# Altium footprint library Inductors THD.PcbLib: 43 footprints (part 3 of 4)
Each footprint in its own frame and in the unit in brackets; x right, y up, seen from the top. Pads: shape width x height; smd on the part's side, far side on the other; paste and mask are expansions set on the pad; w line width, h text height; cw(c..) or ccw(c..) is an arc to the next point about the centre after c.
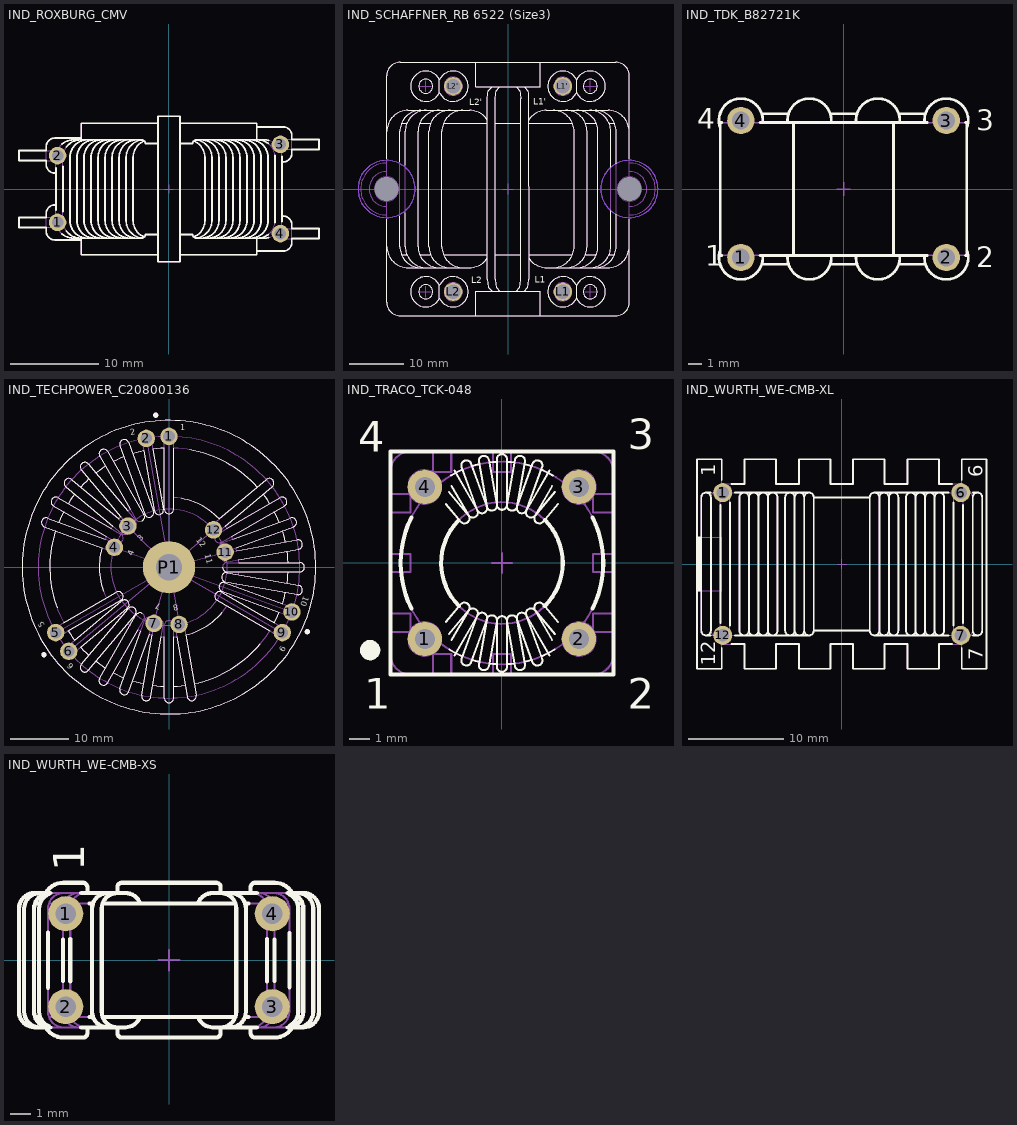
[diagram p2: the footprints below, top view; thin cyan lines are the x and y axes]

## IND_ROXBURG_CMV [mm] "PCB Mounted Common Mode Chokes Body L 34mm x W 17mm x H 31mm"
height 32
pads (4):
  round 2 hole 1.3: 1(-12.7,-3.81) 2(-12.7,3.81) 3(12.7,5.08) 4(12.7,-5.08)
Top Overlay:
  lines w0.2: -12.89,-2.423 -12.89,2.423 ; -12.89,-1.81 -13,-1.81 ccw(c-13,-2.81) -14,-2.81 -14,-3.24 -17.095,-3.24 -17.095,-4.38 -14,-4.38 -14,-4.81 ccw(c-13,-4.81) -13,-5.81 -10,-5.81 ; -12.89,1.81 -13,1.81 cw(c-13,2.81) -14,2.81 -14,3.24 -17.095,3.24 -17.095,4.38 -14,4.38 -14,4.81 cw(c-13,4.81) -13,5.81 -10,5.81 ; -12.195,-5.116 ccw(c-10.89,-3.6) -10.89,-5.6 -3.16,-5.6 ccw(c-3.16,-5.1) -2.67,-5.2 -1.25,-5.2 ; -12.195,5.116 cw(c-10.89,3.6) -10.89,5.6 -3.16,5.6 cw(c-3.16,5.1) -2.67,5.2 -1.25,5.2 ; -12.09,-2.55 -12.09,2.55 ; -11.699,-4.788 ccw(c-10.09,-3.6) -10.09,-5.6 ; -11.699,4.788 cw(c-10.09,3.6) -10.09,5.6 ; -10,-5.6 -10,-7.5 -1.25,-7.5 ; -10,5.6 -10,7.5 -1.25,7.5 ; -9.29,-5.6 cw(c-9.29,-3.6) -11.29,-3.6 -11.29,3.6 cw(c-9.29,3.6) -9.29,5.6 ; -8.49,-5.6 cw(c-8.49,-3.6) -10.49,-3.6 -10.49,3.6 cw(c-8.49,3.6) -8.49,5.6 ; -7.69,-5.6 cw(c-7.69,-3.6) -9.69,-3.6 -9.69,3.6 cw(c-7.69,3.6) -7.69,5.6 ; -6.89,-5.6 cw(c-6.89,-3.6) -8.89,-3.6 -8.89,3.6 cw(c-6.89,3.6) -6.89,5.6 ; -6.09,-5.6 cw(c-6.09,-3.6) -8.09,-3.6 -8.09,3.6 cw(c-6.09,3.6) -6.09,5.6 ; -5.29,-5.6 cw(c-5.29,-3.6) -7.29,-3.6 -7.29,3.6 cw(c-5.29,3.6) -5.29,5.6 ; -4.66,5.6 ccw(c-4.476,3.594) -6.49,3.6 -6.49,-3.6 ccw(c-4.49,-3.6) -4.49,-5.6 ; -3.69,-5.6 cw(c-3.69,-3.6) -5.69,-3.6 -5.69,3.6 cw(c-3.69,3.6) -3.69,5.6 ; -3.07,-5.592 cw(c-2.89,-3.6) -4.89,-3.6 -4.89,3.6 cw(c-2.89,3.6) -3.07,5.592 ; -2.82,5.466 ccw(c-2.076,3.594) -4.09,3.6 -4.09,-3.6 ccw(c-2.09,-3.6) -2.817,-5.463 ; 1.25,-7.5 10,-7.5 10,-5.6 ; 1.25,-5.2 2.67,-5.2 ccw(c3.16,-5.1) 3.16,-5.6 10.89,-5.6 ccw(c10.89,-3.6) 11.378,-5.54 ; 1.25,5.2 2.67,5.2 cw(c3.16,5.1) 3.16,5.6 10.89,5.6 cw(c10.89,3.6) 11.378,5.54 ; 1.25,7.5 10,7.5 10,5.6 ; 2.817,-5.463 ccw(c2.09,-3.6) 4.09,-3.6 4.09,3.6 ccw(c2.076,3.594) 2.82,5.466 ; 3.07,-5.592 ccw(c2.89,-3.6) 4.89,-3.6 4.89,3.6 ccw(c2.89,3.6) 3.07,5.592 ; 3.69,-5.6 ccw(c3.69,-3.6) 5.69,-3.6 5.69,3.6 ccw(c3.69,3.6) 3.69,5.6 ; 4.49,-5.6 ccw(c4.49,-3.6) 6.49,-3.6 6.49,3.6 ccw(c4.476,3.594) 4.66,5.6 ; 5.29,-5.6 ccw(c5.29,-3.6) 7.29,-3.6 7.29,3.6 ccw(c5.29,3.6) 5.29,5.6 ; 6.09,-5.6 ccw(c6.09,-3.6) 8.09,-3.6 8.09,3.6 ccw(c6.09,3.6) 6.09,5.6 ; 6.89,-5.6 ccw(c6.89,-3.6) 8.89,-3.6 8.89,3.6 ccw(c6.89,3.6) 6.89,5.6 ; 7.69,-5.6 ccw(c7.69,-3.6) 9.69,-3.6 9.69,3.6 ccw(c7.69,3.6) 7.69,5.6 ; 8.49,-5.6 ccw(c8.49,-3.6) 10.49,-3.6 10.49,3.6 ccw(c8.49,3.6) 8.49,5.6 ; 9.29,-5.6 ccw(c9.29,-3.6) 11.29,-3.6 11.29,3.6 ccw(c9.29,3.6) 9.29,5.6 ; 10,-7.08 13,-7.08 ccw(c13,-6.08) 14,-6.08 14,-5.65 17.096,-5.65 17.096,-4.51 14,-4.51 14,-4.08 ccw(c13,-4.08) 13,-3.08 12.9,-3.08 ; 10,7.08 13,7.08 cw(c13,6.08) 14,6.08 14,5.65 17.096,5.65 17.096,4.51 14,4.51 14,4.08 cw(c13,4.08) 13,3.08 12.9,3.08 ; 10.09,-5.6 ccw(c10.09,-3.6) 11.304,-5.189 ; 10.09,5.6 cw(c10.09,3.6) 11.304,5.189 ; 12.077,-3.826 ccw(c10.09,-3.6) 12.09,-3.6 12.09,3.6 ccw(c10.09,3.6) 12.077,3.826 ; 12.888,-3.693 ccw(c10.89,-3.6) 12.89,-3.6 12.89,3.6 ccw(c10.89,3.6) 12.888,3.693 ; -1.25,-8.3 1.25,-8.3 1.25,8.3 -1.25,8.3 -1.25,-8.3
Mechanical 8:
  lines w0.1: -13.2,-3.81 -12.7,-3.81 ; -13.2,3.81 -12.7,3.81 ; -12.7,-4.31 -12.7,-3.81 ; -12.7,-3.31 -12.7,-3.81 ; -12.7,3.31 -12.7,3.81 ; -12.7,4.31 -12.7,3.81 ; -12.2,-3.81 -12.7,-3.81 ; -12.2,3.81 -12.7,3.81 ; -0.5,0 0,0 ; 0,-0.5 0,0 ; 0,0.5 0,0 ; 0.5,0 0,0 ; 12.2,-5.08 12.7,-5.08 ; 12.2,5.08 12.7,5.08 ; 12.7,-5.58 12.7,-5.08 ; 12.7,-4.58 12.7,-5.08 ; 12.7,4.58 12.7,5.08 ; 12.7,5.58 12.7,5.08 ; 13.2,-5.08 12.7,-5.08 ; 13.2,5.08 12.7,5.08
Mechanical 14:
  lines w0.1: -12.89,-3.24 -17.095,-3.24 -17.095,-4.38 -12.732,-4.38 ; -12.89,-1.81 -13,-1.81 ccw(c-13,-2.81) -14,-2.81 -14,-4.81 ccw(c-13,-4.81) -13,-5.81 -10,-5.81 ; -12.89,1.81 -13,1.81 cw(c-13,2.81) -14,2.81 -14,4.81 cw(c-13,4.81) -13,5.81 -10,5.81 ; -12.89,3.24 -17.095,3.24 -17.095,4.38 -12.732,4.38 ; -10.09,-5.6 cw(c-10.09,-3.6) -12.09,-3.6 -12.09,3.6 cw(c-10.09,3.6) -10.09,5.6 ; -10,-5.6 -10,-7.5 -1.25,-7.5 ; -10,5.6 -10,7.5 -1.25,7.5 ; -9.29,-5.6 cw(c-9.29,-3.6) -11.29,-3.6 -11.29,3.6 cw(c-9.29,3.6) -9.29,5.6 ; -8.49,-5.6 cw(c-8.49,-3.6) -10.49,-3.6 -10.49,3.6 cw(c-8.49,3.6) -8.49,5.6 ; -7.69,-5.6 cw(c-7.69,-3.6) -9.69,-3.6 -9.69,3.6 cw(c-7.69,3.6) -7.69,5.6 ; -6.89,-5.6 cw(c-6.89,-3.6) -8.89,-3.6 -8.89,3.6 cw(c-6.89,3.6) -6.89,5.6 ; -6.09,-5.6 cw(c-6.09,-3.6) -8.09,-3.6 -8.09,3.6 cw(c-6.09,3.6) -6.09,5.6 ; -5.29,-5.6 cw(c-5.29,-3.6) -7.29,-3.6 -7.29,3.6 cw(c-5.29,3.6) -5.29,5.6 ; -4.66,5.6 ccw(c-4.476,3.594) -6.49,3.6 -6.49,-3.6 ccw(c-4.49,-3.6) -4.49,-5.6 ; -3.69,-5.6 cw(c-3.69,-3.6) -5.69,-3.6 -5.69,3.6 cw(c-3.69,3.6) -3.69,5.6 ; -3.07,-5.592 cw(c-2.89,-3.6) -4.89,-3.6 -4.89,3.6 cw(c-2.89,3.6) -3.07,5.592 ; -2.82,5.466 ccw(c-2.076,3.594) -4.09,3.6 -4.09,-3.6 ccw(c-2.09,-3.6) -2.817,-5.463 ; -1.25,-5.2 -2.67,-5.2 cw(c-3.16,-5.1) -3.16,-5.6 -10.89,-5.6 cw(c-10.89,-3.6) -12.89,-3.6 -12.89,3.6 cw(c-10.89,3.6) -10.89,5.6 -3.16,5.6 cw(c-3.16,5.1) -2.67,5.2 -1.25,5.2 ; 1.25,-7.5 10,-7.5 10,-5.6 ; 1.25,-5.2 2.67,-5.2 ccw(c3.16,-5.1) 3.16,-5.6 10.89,-5.6 ccw(c10.89,-3.6) 12.89,-3.6 12.89,3.6 ccw(c10.89,3.6) 10.89,5.6 3.16,5.6 ccw(c3.16,5.1) 2.67,5.2 1.25,5.2 ; 1.25,7.5 10,7.5 10,5.6 ; 2.817,-5.463 ccw(c2.09,-3.6) 4.09,-3.6 4.09,3.6 ccw(c2.076,3.594) 2.82,5.466 ; 3.07,-5.592 ccw(c2.89,-3.6) 4.89,-3.6 4.89,3.6 ccw(c2.89,3.6) 3.07,5.592 ; 3.69,-5.6 ccw(c3.69,-3.6) 5.69,-3.6 5.69,3.6 ccw(c3.69,3.6) 3.69,5.6 ; 4.49,-5.6 ccw(c4.49,-3.6) 6.49,-3.6 6.49,3.6 ccw(c4.476,3.594) 4.66,5.6 ; 5.29,-5.6 ccw(c5.29,-3.6) 7.29,-3.6 7.29,3.6 ccw(c5.29,3.6) 5.29,5.6 ; 6.09,-5.6 ccw(c6.09,-3.6) 8.09,-3.6 8.09,3.6 ccw(c6.09,3.6) 6.09,5.6 ; 6.89,-5.6 ccw(c6.89,-3.6) 8.89,-3.6 8.89,3.6 ccw(c6.89,3.6) 6.89,5.6 ; 7.69,-5.6 ccw(c7.69,-3.6) 9.69,-3.6 9.69,3.6 ccw(c7.69,3.6) 7.69,5.6 ; 8.49,-5.6 ccw(c8.49,-3.6) 10.49,-3.6 10.49,3.6 ccw(c8.49,3.6) 8.49,5.6 ; 9.29,-5.6 ccw(c9.29,-3.6) 11.29,-3.6 11.29,3.6 ccw(c9.29,3.6) 9.29,5.6 ; 10,-7.08 13,-7.08 ccw(c13,-6.08) 14,-6.08 14,-4.08 ccw(c13,-4.08) 13,-3.08 12.9,-3.08 ; 10,7.08 13,7.08 cw(c13,6.08) 14,6.08 14,4.08 cw(c13,4.08) 13,3.08 12.9,3.08 ; 10.09,-5.6 ccw(c10.09,-3.6) 12.09,-3.6 12.09,3.6 ccw(c10.09,3.6) 10.09,5.6 ; 12.51,-4.787 12.51,-5.65 17.096,-5.65 17.096,-4.51 12.681,-4.51 ; 12.51,4.787 12.51,5.65 17.096,5.65 17.096,4.51 12.681,4.51 ; -1.25,-8.3 1.25,-8.3 1.25,8.3 -1.25,8.3 -1.25,-8.3
3D body "IND_ROXBURG_CMV.stp": height 31, standoff -3.6, extent -17.095,-8.3 17.096,8.3

## IND_SCHAFFNER_RB 6522 (Size3) [mm] "PCB Mounted Common Mode Chokes, Body L 45mm x W 46.93mm x H 52mm"
height 52
pads (6):
  round 1 hole 4.5 unplated mask+1.75: 5(-22.5,0) 6(22.5,0)
  round 3.4 hole 2.7: L1(10.16,-19.05) L1'(10.16,19.05) L2(-10.16,-19.05) L2'(-10.16,19.05)
Bottom Layer keep-out:
  circle w0.1: c22.5,0 r5.3
  circle w0.1: c-22.5,0 r5.3
Top Overlay:
  circle w0.2: c15.24,-19.05 r1.3
  circle w0.2: c10.16,-19.05 r1.3
  circle w0.2: c-15.24,-19.05 r1.3
  circle w0.2: c-15.24,19.05 r1.3
  circle w0.2: c15.24,19.05 r1.3
  lines w0.2: -22.5,-5.6 -22.5,-20.965 ccw(c-20,-20.965) -20,-23.465 20,-23.465 ccw(c20,-20.965) 22.5,-20.965 22.5,-5.6 ; -22.5,5.6 -22.5,20.965 cw(c-20,20.965) -20,23.465 20,23.465 cw(c20,20.965) 22.5,20.965 22.5,5.6 ; -22.448,-5.6 -22.448,-10.665 ccw(c-18.548,-10.665) -18.548,-14.565 -7.098,-14.565 ccw(c-7.098,-10.665) -3.813,-12.766 ; -22.448,5.6 -22.448,10.665 cw(c-18.548,10.665) -18.548,14.565 -7.098,14.565 cw(c-7.098,10.665) -3.813,12.766 ; -20.048,-5.035 -20.048,-10.665 ccw(c-16.148,-10.665) -16.148,-14.565 ; -20.048,5.035 -20.048,10.665 cw(c-16.148,10.665) -16.148,14.565 ; -19.748,-12.165 -18.748,-12.165 ; -19.748,12.165 -18.748,12.165 ; -19.048,-4.41 -19.048,-10.665 ccw(c-15.148,-10.665) -15.148,-14.565 ; -19.048,4.41 -19.048,10.665 cw(c-15.148,10.665) -15.148,14.565 ; -16.348,-12.165 -14.348,-12.165 ; -16.348,12.165 -14.348,12.165 ; -12.748,-14.565 cw(c-12.748,-10.665) -16.648,-10.665 -16.648,10.665 cw(c-12.748,10.665) -12.748,14.565 ; -11.948,-12.165 -3.813,-12.165 ; -11.948,12.165 -3.813,12.165 ; -10.748,-14.565 cw(c-10.748,-10.665) -14.648,-10.665 -14.648,10.665 cw(c-10.748,10.665) -10.748,14.565 ; -8.348,-14.565 cw(c-8.348,-10.665) -12.248,-10.665 -12.248,10.665 cw(c-8.348,10.665) -8.348,14.565 ; -6,-23.465 -6,-18.965 6,-18.965 6,-23.465 ; -6,23.465 -6,18.965 6,18.965 6,23.465 ; -2.883,-18.965 -3.622,-18.216 -3.813,-16.743 -3.813,16.743 -3.759,17.699 -3.622,18.216 -2.883,18.965 ; -2.331,-12.165 2.331,-12.165 ; -2.331,12.165 2.331,12.165 ; -1.529,-18.965 -2.141,-18.216 -2.277,-17.699 -2.331,-16.743 -2.331,16.743 -2.277,17.699 -2.141,18.216 -1.529,18.965 ; 1.529,-18.965 2.141,-18.216 2.277,-17.699 2.331,-16.743 2.331,16.743 2.277,17.699 2.141,18.216 1.529,18.965 ; 3.01,-18.965 3.622,-18.216 3.759,-17.699 3.813,-16.743 3.759,17.699 3.622,18.216 3.01,18.965 ; 3.767,12.693 cw(c7.098,10.665) 7.098,14.565 18.548,14.565 cw(c18.548,10.665) 22.448,10.665 22.448,5.6 ; 3.768,12.165 11.948,12.165 ; 3.807,-12.757 ccw(c7.098,-10.665) 7.098,-14.565 18.548,-14.565 ccw(c18.548,-10.665) 22.448,-10.665 22.448,-5.6 ; 3.806,-12.165 11.948,-12.165 ; 8.348,-14.565 ccw(c8.348,-10.665) 12.248,-10.665 12.248,10.665 ccw(c8.348,10.665) 8.348,14.565 ; 10.748,-14.565 ccw(c10.748,-10.665) 14.648,-10.665 14.648,10.665 ccw(c10.748,10.665) 10.748,14.565 ; 12.748,-14.565 ccw(c12.748,-10.665) 16.648,-10.665 16.648,10.665 ccw(c12.748,10.665) 12.748,14.565 ; 14.348,-12.165 16.348,-12.165 ; 14.348,12.165 16.348,12.165 ; 15.148,-14.565 ccw(c15.148,-10.665) 19.048,-10.665 19.048,-4.022 ; 15.148,14.565 cw(c15.148,10.665) 19.048,10.665 19.048,4.022 ; 16.148,-14.565 ccw(c16.148,-10.665) 20.048,-10.665 20.048,-4.699 ; 16.148,14.565 cw(c16.148,10.665) 20.048,10.665 20.048,4.699 ; 18.748,-12.165 19.748,-12.165 ; 18.748,12.165 19.748,12.165 ; -12.7,-20.228 ccw(c-10.16,-19.05) -12.7,-17.872 ; -12.7,-20.228 cw(c-15.24,-19.05) -12.7,-17.872 ; -12.7,-20.228 -12.7,-17.872 ; -12.7,17.872 ccw(c-10.16,19.05) -12.7,20.228 ; -12.7,17.872 cw(c-15.24,19.05) -12.7,20.228 ; -12.7,17.872 -12.7,20.228 ; 12.7,-20.228 ccw(c15.24,-19.05) 12.7,-17.872 ; 12.7,-20.228 cw(c10.16,-19.05) 12.7,-17.872 ; 12.7,-20.228 12.7,-17.872 ; 12.7,17.872 cw(c10.16,19.05) 12.7,20.228 ; 12.7,17.872 ccw(c15.24,19.05) 12.7,20.228 ; 12.7,17.872 12.7,20.228
  text "L2" at -6.8,-17.5 h1.2
  text "L2'" at -7.2,15.5 h1.2
  text "L1" at 5,-17.4 h1.2
  text "L1'" at 4.7,15.6 h1.2
Mechanical 8:
  circle w0.1: c22.5,0 r5.3
  circle w0.1: c-10.16,19.05 r1.7
  circle w0.1: c-10.16,-19.05 r1.7
  circle w0.1: c10.16,-19.05 r1.7
  circle w0.1: c10.16,19.05 r1.7
  circle w0.1: c-22.5,0 r5.3
  circle w0.1: c22.5,0 r2.25
  circle w0.1: c-22.5,0 r2.25
  circle w0.1: c-10.16,-19.05 r1.35
  circle w0.1: c10.16,-19.05 r1.35
  circle w0.1: c10.16,19.05 r1.35
  circle w0.1: c-10.16,19.05 r1.35
  lines w0.1: -23.5,0 -22.5,0 ; -22.5,-1 -22.5,0 ; -22.5,1 -22.5,0 ; -21.5,0 -22.5,0 ; -16.24,-19.05 -15.24,-19.05 ; -16.24,19.05 -15.24,19.05 ; -15.24,-20.05 -15.24,-19.05 ; -15.24,-18.05 -15.24,-19.05 ; -15.24,18.05 -15.24,19.05 ; -15.24,20.05 -15.24,19.05 ; -14.24,-19.05 -15.24,-19.05 ; -14.24,19.05 -15.24,19.05 ; -11.16,-19.05 -10.16,-19.05 ; -11.16,19.05 -10.16,19.05 ; -10.16,-20.05 -10.16,-19.05 ; -10.16,-18.05 -10.16,-19.05 ; -10.16,18.05 -10.16,19.05 ; -10.16,20.05 -10.16,19.05 ; -9.16,-19.05 -10.16,-19.05 ; -9.16,19.05 -10.16,19.05 ; -1,0 0,0 ; 0,-1 0,0 ; 0,1 0,0 ; 1,0 0,0 ; 9.16,-19.05 10.16,-19.05 ; 9.16,19.05 10.16,19.05 ; 10.16,-20.05 10.16,-19.05 ; 10.16,-18.05 10.16,-19.05 ; 10.16,18.05 10.16,19.05 ; 10.16,20.05 10.16,19.05 ; 11.16,-19.05 10.16,-19.05 ; 11.16,19.05 10.16,19.05 ; 14.24,-19.05 15.24,-19.05 ; 14.24,19.05 15.24,19.05 ; 15.24,-20.05 15.24,-19.05 ; 15.24,-18.05 15.24,-19.05 ; 15.24,18.05 15.24,19.05 ; 15.24,20.05 15.24,19.05 ; 16.24,-19.05 15.24,-19.05 ; 16.24,19.05 15.24,19.05 ; 21.5,0 22.5,0 ; 22.5,-1 22.5,0 ; 22.5,1 22.5,0 ; 23.5,0 22.5,0
Mechanical 14:
  circle w0.1: c10.16,-19.05 r1.3
  circle w0.1: c15.24,-19.05 r1.3
  circle w0.1: c10.16,-19.05 r1.3
  circle w0.1: c-15.24,-19.05 r1.3
  circle w0.1: c-10.16,-19.05 r1.3
  circle w0.1: c-15.24,19.05 r1.3
  circle w0.1: c-10.16,19.05 r1.3
  circle w0.1: c10.16,19.05 r1.3
  circle w0.1: c15.24,19.05 r1.3
  lines w0.1: -22.5,-4.8 -22.5,-20.965 ccw(c-20,-20.965) -20,-23.465 20,-23.465 ccw(c20,-20.965) 22.5,-20.965 22.5,-4.8 ; -22.5,4.8 -22.5,20.965 cw(c-20,20.965) -20,23.465 20,23.465 cw(c20,20.965) 22.5,20.965 22.5,4.8 ; -22.448,-4.8 cw(c-22.5,0) -22.448,4.8 ; -22.448,-3.233 cw(c-22.5,0) -22.448,3.233 ; -19.748,-12.165 -18.748,-12.165 ; -19.748,12.165 -18.748,12.165 ; -16.348,-12.165 -14.348,-12.165 ; -16.348,12.165 -14.348,12.165 ; -16.148,-14.565 cw(c-16.148,-10.665) -20.048,-10.665 -20.048,10.665 cw(c-16.148,10.665) -16.148,14.565 ; -15.148,-14.565 cw(c-15.148,-10.665) -19.048,-10.665 -19.048,10.665 cw(c-15.148,10.665) -15.148,14.565 ; -12.748,-14.565 cw(c-12.748,-10.665) -16.648,-10.665 -16.648,10.665 cw(c-12.748,10.665) -12.748,14.565 ; -11.948,-12.165 -3.813,-12.165 ; -11.948,12.165 -3.813,12.165 ; -10.748,-14.565 cw(c-10.748,-10.665) -14.648,-10.665 -14.648,10.665 cw(c-10.748,10.665) -10.748,14.565 ; -8.348,-14.565 cw(c-8.348,-10.665) -12.248,-10.665 -12.248,10.665 cw(c-8.348,10.665) -8.348,14.565 ; -6,-23.465 -6,-18.965 6,-18.965 6,-23.465 ; -6,23.465 -6,18.965 6,18.965 6,23.465 ; -3.813,-12.766 cw(c-7.098,-10.665) -7.098,-14.565 -18.548,-14.565 cw(c-18.548,-10.665) -22.448,-10.665 -22.448,10.665 cw(c-18.548,10.665) -18.548,14.565 -7.098,14.565 cw(c-7.098,10.665) -3.813,12.766 ; -2.883,-18.965 -3.622,-18.216 -3.813,-16.743 -3.813,16.743 -3.759,17.699 -3.622,18.216 -2.883,18.965 ; -2.331,-12.165 2.331,-12.165 ; -2.331,12.165 2.331,12.165 ; -1.529,-18.965 -2.141,-18.216 -2.277,-17.699 -2.331,-16.743 -2.331,16.743 -2.277,17.699 -2.141,18.216 -1.529,18.965 ; 1.529,-18.965 2.141,-18.216 2.277,-17.699 2.331,-16.743 2.331,16.743 2.277,17.699 2.141,18.216 1.529,18.965 ; 3.01,-18.965 3.622,-18.216 3.759,-17.699 3.813,-16.743 3.759,17.699 3.622,18.216 3.01,18.965 ; 3.767,12.693 cw(c7.098,10.665) 7.098,14.565 18.548,14.565 cw(c18.548,10.665) 22.448,10.665 22.448,-10.665 cw(c18.548,-10.665) 18.548,-14.565 7.098,-14.565 cw(c7.098,-10.665) 3.807,-12.757 ; 3.768,12.165 11.948,12.165 ; 3.806,-12.165 11.948,-12.165 ; 8.348,-14.565 ccw(c8.348,-10.665) 12.248,-10.665 12.248,10.665 ccw(c8.348,10.665) 8.348,14.565 ; 10.748,-14.565 ccw(c10.748,-10.665) 14.648,-10.665 14.648,10.665 ccw(c10.748,10.665) 10.748,14.565 ; 12.748,-14.565 ccw(c12.748,-10.665) 16.648,-10.665 16.648,10.665 ccw(c12.748,10.665) 12.748,14.565 ; 14.348,-12.165 16.348,-12.165 ; 14.348,12.165 16.348,12.165 ; 15.148,-14.565 ccw(c15.148,-10.665) 19.048,-10.665 19.048,10.665 ccw(c15.148,10.665) 15.148,14.565 ; 16.148,-14.565 ccw(c16.148,-10.665) 20.048,-10.665 20.048,10.665 ccw(c16.148,10.665) 16.148,14.565 ; 18.748,-12.165 19.748,-12.165 ; 18.748,12.165 19.748,12.165 ; 22.448,-4.8 ccw(c22.5,0) 22.448,4.8 ; 22.448,-3.233 ccw(c22.5,0) 22.448,3.233 ; -12.7,-20.228 ccw(c-10.16,-19.05) -12.7,-17.872 ; -12.7,-20.228 cw(c-15.24,-19.05) -12.7,-17.872 ; -12.7,-20.228 -12.7,-17.872 ; -12.7,17.872 ccw(c-10.16,19.05) -12.7,20.228 ; -12.7,17.872 cw(c-15.24,19.05) -12.7,20.228 ; -12.7,17.872 -12.7,20.228 ; 12.7,-20.228 ccw(c15.24,-19.05) 12.7,-17.872 ; 12.7,-20.228 cw(c10.16,-19.05) 12.7,-17.872 ; 12.7,-20.228 12.7,-17.872 ; 12.7,17.872 cw(c10.16,19.05) 12.7,20.228 ; 12.7,17.872 ccw(c15.24,19.05) 12.7,20.228 ; 12.7,17.872 12.7,20.228
  text "L1'" at 4.7,15.6 h1.2
  text "L1" at 5,-17.4 h1.2
  text "L2'" at -7.2,15.5 h1.2
  text "L2" at -6.8,-17.5 h1.2
3D body "IND_SCHAFFNER_RB 6522 (Size3).stp": height 47.25, standoff -4.5, extent -27.3,-23.465 27.3,23.465

## IND_TDK_B82721K [mm] "Current-compensated ring core double choke, Body 18.2mm x 13.2mm, B82721K Series"
height 20.3
pads (4):
  round 2 hole 1.3: 1(-7.5,-5) 2(7.5,-5) 3(7.5,5) 4(-7.5,5)
Top Overlay:
  lines w0.2: -9,-4.443 ccw(c-7.5,-5) -5.907,-4.85 ; -9,4.443 cw(c-7.5,5) -5.907,4.85 ; -8.892,-4.85 -9,-4.85 -9,4.85 -8.892,4.85 ; -6.108,-4.85 6.108,-4.85 ; -6.108,4.85 6.108,4.85 ; -5.98,-5.5 -4.02,-5.5 ; -5.98,5.5 -4.02,5.5 ; -4.093,-4.85 ccw(c-2.5,-5) -0.907,-4.85 ; -4.093,4.85 cw(c-2.5,5) -0.907,4.85 ; -3.65,-4.85 -3.65,4.85 ; -0.98,-5.5 0.98,-5.5 ; -0.98,5.5 0.98,5.5 ; 0.907,-4.85 ccw(c2.5,-5) 4.093,-4.85 ; 0.907,4.85 cw(c2.5,5) 4.093,4.85 ; 3.65,-4.85 3.65,4.85 ; 4.02,-5.5 5.98,-5.5 ; 4.02,5.5 5.98,5.5 ; 5.907,-4.85 ccw(c7.5,-5) 9,-4.443 ; 5.907,4.85 cw(c7.5,5) 9,4.443 ; 8.892,-4.85 9,-4.85 9,4.85 8.892,4.85
  text "1" at -10.1,-5.6 h1.5
  text "4" at -10.7,4.4 h1.5
  text "3" at 9.7,4.3 h1.5
  text "2" at 9.7,-5.7 h1.5
Mechanical 8:
  lines w0.1: -8,-5 -7.5,-5 ; -8,5 -7.5,5 ; -7.5,-5.5 -7.5,-5 ; -7.5,-4.5 -7.5,-5 ; -7.5,4.5 -7.5,5 ; -7.5,5.5 -7.5,5 ; -7,-5 -7.5,-5 ; -7,5 -7.5,5 ; -0.5,0 0,0 ; 0,-0.5 0,0 ; 0,0.5 0,0 ; 0.5,0 0,0 ; 7,-5 7.5,-5 ; 7,5 7.5,5 ; 7.5,-5.5 7.5,-5 ; 7.5,-4.5 7.5,-5 ; 7.5,4.5 7.5,5 ; 7.5,5.5 7.5,5 ; 8,-5 7.5,-5 ; 8,5 7.5,5
Mechanical 14:
  lines w0.1: -9,-4.443 ccw(c-7.5,-5) -5.907,-4.85 ; -9,4.443 cw(c-7.5,5) -5.907,4.85 ; -5.98,-5.5 -4.02,-5.5 ; -5.98,5.5 -4.02,5.5 ; -4.093,-4.85 ccw(c-2.5,-5) -0.907,-4.85 ; -4.093,4.85 cw(c-2.5,5) -0.907,4.85 ; -3.65,-4.85 -3.65,4.85 ; -0.98,-5.5 0.98,-5.5 ; -0.98,5.5 0.98,5.5 ; 0.907,-4.85 ccw(c2.5,-5) 4.093,-4.85 ; 0.907,4.85 cw(c2.5,5) 4.093,4.85 ; 3.65,-4.85 3.65,4.85 ; 4.02,-5.5 5.98,-5.5 ; 4.02,5.5 5.98,5.5 ; 5.907,-4.85 ccw(c7.5,-5) 9,-4.443 ; 5.907,4.85 cw(c7.5,5) 9,4.443 ; -9,-4.85 -9,4.85 9,4.85 9,-4.85 -9,-4.85
  text "1" at -10.1,-5.6 h1.5
  text "4" at -10.7,4.4 h1.5
  text "3" at 9.7,4.3 h1.5
  text "2" at 9.7,-5.7 h1.5
3D body "IND_TDK_B82721K.stp": height 20.3, standoff -3, extent -9.093,-6.6 9.094,6.6

## IND_TECHPOWER_C20800136 [mm] "3-wire Common Mode Power Inductor"
height 45
pads (13):
  round 3 hole 2: 1(0,22.5) 2(-3.907,22.158) 3(-7.071,7.071) 4(-9.397,3.42) 5(-19.486,-11.25) 6(-17.236,-14.463) 7(-2.588,-9.659) 8(1.736,-9.848) 9(19.486,-11.25) 10(21.143,-7.695) 11(9.659,2.588) 12(7.66,6.428)
  round 9 hole 4.5: P1(0,0)
Top Overlay:
  circle w0.2: c0,0 r25.25
  circle w0.5: c-2.288,26.15 r0.2
  circle w0.5: c-21.503,-15.056 r0.2
  circle w0.5: c23.791,-11.094 r0.2
  lines w0.2: -19.523,6.254 ccw(c0,0) -19.264,-7.011 ; -18.975,7.758 cw(c0,0) -18.14,9.549 ; -18.14,-9.549 -9.06,-4.307 cw(c-8.66,-5) -8.26,-5.693 -17.34,-10.935 ccw(c0,0) -16.206,-12.554 -8.175,-5.815 cw(c-7.66,-6.428) -7.146,-7.041 -15.178,-13.78 ccw(c0,0) -13.78,-15.178 ; -17.34,10.935 cw(c0,0) -16.206,12.554 ; -15.178,13.78 cw(c0,0) -13.78,15.178 ; -12.554,-16.206 ccw(c0,0) -10.935,-17.34 ; -12.554,16.206 cw(c0,0) -10.935,17.34 ; -11.276,-4.104 cw(c0,0) -11.525,3.343 -21.417,6.944 cw(c-21.143,7.695) -20.869,8.447 -10.978,4.847 ; -10.769,5.294 -19.886,10.557 cw(c-19.486,11.25) -19.086,11.943 -9.969,6.679 ; -9.686,7.083 -17.75,13.85 cw(c-17.236,14.463) -16.722,15.076 -8.658,8.309 ; -9.549,-18.14 ccw(c0,0) -7.758,-18.975 ; -9.549,18.14 cw(c0,0) -7.758,18.975 ; -8.309,8.658 -15.076,16.722 cw(c-14.463,17.236) -13.85,17.75 -7.083,9.686 ; -6.679,9.969 -11.943,19.086 cw(c-11.25,19.486) -10.557,19.886 -4.307,9.06 cw(c-5,8.66) -4.6,7.967 ; -6.254,-19.523 ccw(c0,0) -4.345,-20.034 ; -6.254,19.523 cw(c0,0) -4.345,20.034 -2.524,9.709 ccw(c-1.736,9.848) -0.949,9.987 -2.769,20.312 cw(c0,0) -0.8,20.484 -0.8,10 ccw(c0,10) 0.8,10 0.8,20.484 ; -5.294,-10.769 -10.557,-19.886 cw(c-11.25,-19.486) -11.943,-19.086 -5.693,-8.26 cw(c-5,-8.66) -4.6,-7.967 ; -4.847,-10.978 -8.447,-20.869 ccw(c-7.695,-21.143) -6.944,-21.417 -3.343,-11.525 ; -2.867,-11.652 -4.695,-22.019 ccw(c-3.907,-22.158) -3.119,-22.297 -1.291,-11.93 ; -2.769,-20.312 ccw(c0,0) -0.8,-20.484 ; -0.8,-11.973 -0.8,-22.5 ccw(c0,-22.5) 0.8,-22.5 0.8,-11.973 ; 0.8,-20.484 ccw(c0,0) 2.769,-20.312 ; 1.291,-11.93 3.119,-22.297 ccw(c3.907,-22.158) 4.695,-22.019 2.867,-11.652 ccw(c0,0) 9.193,-7.713 ; 2.084,11.818 cw(c0,0) 8.658,8.309 16.722,15.076 cw(c17.236,14.463) 17.75,13.85 9.686,7.083 ; 3.56,20.189 cw(c0,0) 15.178,13.78 ; 4.345,-20.034 ccw(c0,0) 15.704,-13.177 ; 9.2,0 ccw(c10,0) 10,-0.8 22.5,-0.8 ccw(c22.5,0) 22.5,0.8 11.973,0.8 ; 9.969,6.679 19.086,11.943 cw(c19.486,11.25) 19.886,10.557 10.769,5.294 ; 10.978,4.847 20.869,8.447 cw(c21.143,7.695) 21.417,6.944 11.525,3.343 ; 11.652,2.867 22.019,4.695 cw(c22.158,3.907) 22.297,3.119 11.93,1.291 ; 16.206,12.554 cw(c0,0) 17.34,10.935 ; 17.34,-10.935 8.26,-5.693 cw(c8.66,-5) 9.06,-4.307 18.14,-9.549 ccw(c0,0) 18.975,-7.758 9.123,-4.172 cw(c9.397,-3.42) 9.671,-2.668 19.523,-6.254 ccw(c0,0) 20.034,-4.345 ; 18.14,9.549 cw(c0,0) 18.975,7.758 ; 19.523,6.254 cw(c0,0) 20.034,4.345 ; 20.312,-2.769 ccw(c0,0) 20.484,-0.8 ; 20.312,2.769 cw(c0,0) 20.484,0.8 ; -15.076,-16.722 ccw(c-14.463,-17.236) -13.85,-17.75 -5.815,-8.175 ccw(c-6.428,-7.66) -7.041,-7.146 -15.076,-16.722 ; -8.447,20.869 cw(c-7.695,21.143) -6.944,21.417 -2.668,9.671 cw(c-3.42,9.397) -4.172,9.123 -8.447,20.869 ; 9.709,-2.524 cw(c9.848,-1.736) 9.987,-0.949 22.297,-3.119 cw(c22.158,-3.907) 22.019,-4.695 9.709,-2.524